# Altium schematic symbol library WR-TBL_Pluggable PCB Header.SchLib: 719 symbols (part 1 of 5) (continued)
## 691308330012
designator P?
WR-TBL Serie 3083 Vertical Reserved PCB Header with Flanges, Pluggable, pitch 3.81mm, 12p; Part Number: 691308330012; Compliance: RoHS; Modularity: No; Pin Number: 12; Rated Current [UL]: 8A; Working Voltage [UL]: 300VAC; ComponentLink1Description: Manufacturer; ComponentLink1URL: http://www.we-online.de; ComponentLink2URL: https://katalog.we-online.de/em/datasheet/691308330012.pdf; ComponentLink2Description: Datasheet; Mounting Technology: THT; Packaging: Box; Operating Temperature: -40 to +115degC; PCB/Cable/Panel: PCB; Pitch: 3.81mm; Published Date: October 2019; Type: Vertical; Publisher: Wurth Elektronik; Application: Pluggable
footprint 691308330012
pins: 1, 2, 3, 4, 5, 6, 7, 8, 9, 10, 11, 12

## 691309310002
designator P?
WR-TBL Serie 3093 Horizontal Reserved PCB Header with Flanges, Pluggable, pitch 3.81mm, 2p; Part Number: 691309310002; Compliance: RoHS; Modularity: No; Pin Number: 2; Rated Current [UL]: 8A; Working Voltage [UL]: 300VAC; ComponentLink1Description: Manufacturer; ComponentLink1URL: http://www.we-online.de; ComponentLink2URL: https://katalog.we-online.de/em/datasheet/691309310002.pdf; ComponentLink2Description: Datasheet; Mounting Technology: THT; Packaging: Box; Operating Temperature: -40 to +115degC; PCB/Cable/Panel: PCB; Pitch: 3.81mm; Published Date: October 2019; Type: Horizontal; Publisher: Wurth Elektronik; Application: Pluggable
footprint 691309310002
pins: 1, 2

## 691309310003
designator P?
WR-TBL Serie 3093 Horizontal Reserved PCB Header with Flanges, Pluggable, pitch 3.81mm, 3p; Part Number: 691309310003; Compliance: RoHS; Modularity: No; Pin Number: 3; Rated Current [UL]: 8A; Working Voltage [UL]: 300VAC; ComponentLink1Description: Manufacturer; ComponentLink1URL: http://www.we-online.de; ComponentLink2URL: https://katalog.we-online.de/em/datasheet/691309310003.pdf; ComponentLink2Description: Datasheet; Mounting Technology: THT; Packaging: Box; Operating Temperature: -40 to +115degC; PCB/Cable/Panel: PCB; Pitch: 3.81mm; Published Date: October 2019; Type: Horizontal; Publisher: Wurth Elektronik; Application: Pluggable
footprint 691309310003
pins: 1, 2, 3

## 691309310004
designator P?
WR-TBL Serie 3093 Horizontal Reserved PCB Header with Flanges, Pluggable, pitch 3.81mm, 4p; Part Number: 691309310004; Compliance: RoHS; Modularity: No; Pin Number: 4; Rated Current [UL]: 8A; Working Voltage [UL]: 300VAC; ComponentLink1Description: Manufacturer; ComponentLink1URL: http://www.we-online.de; ComponentLink2URL: https://katalog.we-online.de/em/datasheet/691309310004.pdf; ComponentLink2Description: Datasheet; Mounting Technology: THT; Packaging: Box; Operating Temperature: -40 to +115degC; PCB/Cable/Panel: PCB; Pitch: 3.81mm; Published Date: October 2019; Type: Horizontal; Publisher: Wurth Elektronik; Application: Pluggable
footprint 691309310004
pins: 1, 2, 3, 4

## 691309310005
designator P?
WR-TBL Serie 3093 Horizontal Reserved PCB Header with Flanges, Pluggable, pitch 3.81mm, 5p; Part Number: 691309310005; Compliance: RoHS; Modularity: No; Pin Number: 5; Rated Current [UL]: 8A; Working Voltage [UL]: 300VAC; ComponentLink1Description: Manufacturer; ComponentLink1URL: http://www.we-online.de; ComponentLink2URL: https://katalog.we-online.de/em/datasheet/691309310005.pdf; ComponentLink2Description: Datasheet; Mounting Technology: THT; Packaging: Box; Operating Temperature: -40 to +115degC; PCB/Cable/Panel: PCB; Pitch: 3.81mm; Published Date: October 2019; Type: Horizontal; Publisher: Wurth Elektronik; Application: Pluggable
footprint 691309310005
pins: 1, 2, 3, 4, 5

## 691309310006
designator P?
WR-TBL Serie 3093 Horizontal Reserved PCB Header with Flanges, Pluggable, pitch 3.81mm, 6p; Part Number: 691309310006; Compliance: RoHS; Modularity: No; Pin Number: 6; Rated Current [UL]: 8A; Working Voltage [UL]: 300VAC; ComponentLink1Description: Manufacturer; ComponentLink1URL: http://www.we-online.de; ComponentLink2URL: https://katalog.we-online.de/em/datasheet/691309310006.pdf; ComponentLink2Description: Datasheet; Mounting Technology: THT; Packaging: Box; Operating Temperature: -40 to +115degC; PCB/Cable/Panel: PCB; Pitch: 3.81mm; Published Date: October 2019; Type: Horizontal; Publisher: Wurth Elektronik; Application: Pluggable
footprint 691309310006
pins: 1, 2, 3, 4, 5, 6

## 691309310007
designator P?
WR-TBL Serie 3093 Horizontal Reserved PCB Header with Flanges, Pluggable, pitch 3.81mm, 7p; Part Number: 691309310007; Compliance: RoHS; Modularity: No; Pin Number: 7; Rated Current [UL]: 8A; Working Voltage [UL]: 300VAC; ComponentLink1Description: Manufacturer; ComponentLink1URL: http://www.we-online.de; ComponentLink2URL: https://katalog.we-online.de/em/datasheet/691309310007.pdf; ComponentLink2Description: Datasheet; Mounting Technology: THT; Packaging: Box; Operating Temperature: -40 to +115degC; PCB/Cable/Panel: PCB; Pitch: 3.81mm; Published Date: October 2019; Type: Horizontal; Publisher: Wurth Elektronik; Application: Pluggable
footprint 691309310007
pins: 1, 2, 3, 4, 5, 6, 7

## 691309310008
designator P?
WR-TBL Serie 3093 Horizontal Reserved PCB Header with Flanges, Pluggable, pitch 3.81mm, 8p; Part Number: 691309310008; Compliance: RoHS; Modularity: No; Pin Number: 8; Rated Current [UL]: 8A; Working Voltage [UL]: 300VAC; ComponentLink1Description: Manufacturer; ComponentLink1URL: http://www.we-online.de; ComponentLink2URL: https://katalog.we-online.de/em/datasheet/691309310008.pdf; ComponentLink2Description: Datasheet; Mounting Technology: THT; Packaging: Box; Operating Temperature: -40 to +115degC; PCB/Cable/Panel: PCB; Pitch: 3.81mm; Published Date: October 2019; Type: Horizontal; Publisher: Wurth Elektronik; Application: Pluggable
footprint 691309310008
pins: 1, 2, 3, 4, 5, 6, 7, 8

## 691309310012
designator P?
WR-TBL Serie 3093 Horizontal Reserved PCB Header with Flanges, Pluggable, pitch 3.81mm, 12p; Part Number: 691309310012; Compliance: RoHS; Modularity: No; Pin Number: 12; Rated Current [UL]: 8A; Working Voltage [UL]: 300VAC; ComponentLink1Description: Manufacturer; ComponentLink1URL: http://www.we-online.de; ComponentLink2URL: https://katalog.we-online.de/em/datasheet/691309310012.pdf; ComponentLink2Description: Datasheet; Mounting Technology: THT; Packaging: Box; Operating Temperature: -40 to +115degC; PCB/Cable/Panel: PCB; Pitch: 3.81mm; Published Date: October 2019; Type: Horizontal; Publisher: Wurth Elektronik; Application: Pluggable
footprint 691309310012
pins: 1, 2, 3, 4, 5, 6, 7, 8, 9, 10, 11, 12

## 691309410002
designator P?
WR-TBL Serie 3094 Reversed Gender Horizontal PCB Header, Pluggable, pitch 7.62mm, 2p; Part Number: 691309410002; Compliance: RoHS; Modularity: No; Pin Number: 2; Rated Current [UL]: 20A; Working Voltage [UL]: 300VAC; ComponentLink1Description: Manufacturer; ComponentLink1URL: http://www.we-online.de; ComponentLink2URL: https://katalog.we-online.de/em/datasheet/691309410002.pdf; ComponentLink2Description: Datasheet; Mounting Technology: THT; Packaging: Box; Operating Temperature: -40 to +105degC; PCB/Cable/Panel: PCB; Pitch: 7.62mm; Published Date: October 2019; Type: Horizontal; Publisher: Wurth Elektronik; Application: Pluggable
footprint 691309410002
pins: 1, 2

## 691309410003
designator P?
WR-TBL Serie 3094 Reversed Gender Horizontal PCB Header, Pluggable, pitch 7.62mm, 3p; Part Number: 691309410003; Compliance: RoHS; Modularity: No; Pin Number: 3; Rated Current [UL]: 20A; Working Voltage [UL]: 300VAC; ComponentLink1Description: Manufacturer; ComponentLink1URL: http://www.we-online.de; ComponentLink2URL: https://katalog.we-online.de/em/datasheet/691309410003.pdf; ComponentLink2Description: Datasheet; Mounting Technology: THT; Packaging: Box; Operating Temperature: -40 to +105degC; PCB/Cable/Panel: PCB; Pitch: 7.62mm; Published Date: October 2019; Type: Horizontal; Publisher: Wurth Elektronik; Application: Pluggable
footprint 691309410003
pins: 1, 2, 3

## 691309410004
designator P?
WR-TBL Serie 3094 Reversed Gender Horizontal PCB Header, Pluggable, pitch 7.62mm, 4p; Part Number: 691309410004; Compliance: RoHS; Modularity: No; Pin Number: 4; Rated Current [UL]: 20A; Working Voltage [UL]: 300VAC; ComponentLink1Description: Manufacturer; ComponentLink1URL: http://www.we-online.de; ComponentLink2URL: https://katalog.we-online.de/em/datasheet/691309410004.pdf; ComponentLink2Description: Datasheet; Mounting Technology: THT; Packaging: Box; Operating Temperature: -40 to +105degC; PCB/Cable/Panel: PCB; Pitch: 7.62mm; Published Date: October 2019; Type: Horizontal; Publisher: Wurth Elektronik; Application: Pluggable
footprint 691309410004
pins: 1, 2, 3, 4

## 691309410005
designator P?
WR-TBL Serie 3094 Reversed Gender Horizontal PCB Header, Pluggable, pitch 7.62mm, 5p; Part Number: 691309410005; Compliance: RoHS; Modularity: No; Pin Number: 5; Rated Current [UL]: 20A; Working Voltage [UL]: 300VAC; ComponentLink1Description: Manufacturer; ComponentLink1URL: http://www.we-online.de; ComponentLink2URL: https://katalog.we-online.de/em/datasheet/691309410005.pdf; ComponentLink2Description: Datasheet; Mounting Technology: THT; Packaging: Box; Operating Temperature: -40 to +105degC; PCB/Cable/Panel: PCB; Pitch: 7.62mm; Published Date: October 2019; Type: Horizontal; Publisher: Wurth Elektronik; Application: Pluggable
footprint 691309410005
pins: 1, 2, 3, 4, 5

## 691309410006
designator P?
WR-TBL Serie 3094 Reversed Gender Horizontal PCB Header, Pluggable, pitch 7.62mm, 6p; Part Number: 691309410006; Compliance: RoHS; Modularity: No; Pin Number: 6; Rated Current [UL]: 20A; Working Voltage [UL]: 300VAC; ComponentLink1Description: Manufacturer; ComponentLink1URL: http://www.we-online.de; ComponentLink2URL: https://katalog.we-online.de/em/datasheet/691309410006.pdf; ComponentLink2Description: Datasheet; Mounting Technology: THT; Packaging: Box; Operating Temperature: -40 to +105degC; PCB/Cable/Panel: PCB; Pitch: 7.62mm; Published Date: October 2019; Type: Horizontal; Publisher: Wurth Elektronik; Application: Pluggable
footprint 691309410006
pins: 1, 2, 3, 4, 5, 6

## 691309410007
designator P?
WR-TBL Serie 3094 Reversed Gender Horizontal PCB Header, Pluggable, pitch 7.62mm, 7p; Part Number: 691309410007; Compliance: RoHS; Modularity: No; Pin Number: 7; Rated Current [UL]: 20A; Working Voltage [UL]: 300VAC; ComponentLink1Description: Manufacturer; ComponentLink1URL: http://www.we-online.de; ComponentLink2URL: https://katalog.we-online.de/em/datasheet/691309410007.pdf; ComponentLink2Description: Datasheet; Mounting Technology: THT; Packaging: Box; Operating Temperature: -40 to +105degC; PCB/Cable/Panel: PCB; Pitch: 7.62mm; Published Date: October 2019; Type: Horizontal; Publisher: Wurth Elektronik; Application: Pluggable
footprint 691309410007
pins: 1, 2, 3, 4, 5, 6, 7

## 691309410008
designator P?
WR-TBL Serie 3094 Reversed Gender Horizontal PCB Header, Pluggable, pitch 7.62mm, 8p; Part Number: 691309410008; Compliance: RoHS; Modularity: No; Pin Number: 8; Rated Current [UL]: 20A; Working Voltage [UL]: 300VAC; ComponentLink1Description: Manufacturer; ComponentLink1URL: http://www.we-online.de; ComponentLink2URL: https://katalog.we-online.de/em/datasheet/691309410008.pdf; ComponentLink2Description: Datasheet; Mounting Technology: THT; Packaging: Box; Operating Temperature: -40 to +105degC; PCB/Cable/Panel: PCB; Pitch: 7.62mm; Published Date: October 2019; Type: Horizontal; Publisher: Wurth Elektronik; Application: Pluggable
footprint 691309410008
pins: 1, 2, 3, 4, 5, 6, 7, 8

## 691309410012
designator P?
WR-TBL Serie 3094 Reversed Gender Horizontal PCB Header, Pluggable, pitch 7.62mm, 12p; Part Number: 691309410012; Compliance: RoHS; Modularity: No; Pin Number: 12; Rated Current [UL]: 20A; Working Voltage [UL]: 300VAC; ComponentLink1Description: Manufacturer; ComponentLink1URL: http://www.we-online.de; ComponentLink2URL: https://katalog.we-online.de/em/datasheet/691309410012.pdf; ComponentLink2Description: Datasheet; Mounting Technology: THT; Packaging: Box; Operating Temperature: -40 to +105degC; PCB/Cable/Panel: PCB; Pitch: 7.62mm; Published Date: October 2019; Type: Horizontal; Publisher: Wurth Elektronik; Application: Pluggable
footprint 691309410012
pins: 1, 2, 3, 4, 5, 6, 7, 8, 9, 10, 11, 12

## 691309510002
designator P?
WR-TBL Serie 3095 Reversed Gender Horizontal PCB Header, Pluggable, pitch 5.08mm, 2p; Part Number: 691309510002; Compliance: RoHS; Modularity: No; Pin Number: 2; Rated Current [UL]: 20A; Working Voltage [UL]: 300VAC; ComponentLink1Description: Manufacturer; ComponentLink1URL: http://www.we-online.de; ComponentLink2URL: https://katalog.we-online.de/em/datasheet/691309510002.pdf; ComponentLink2Description: Datasheet; Mounting Technology: THT; Packaging: Box; Operating Temperature: -40 to +105degC; PCB/Cable/Panel: PCB; Pitch: 5.08mm; Published Date: October 2019; Type: Horizontal; Publisher: Wurth Elektronik; Application: Pluggable
footprint 691309510002
pins: 1, 2

## 691309510003
designator P?
WR-TBL Serie 3095 Reversed Gender Horizontal PCB Header, Pluggable, pitch 5.08mm, 3p; Part Number: 691309510003; Compliance: RoHS; Modularity: No; Pin Number: 3; Rated Current [UL]: 20A; Working Voltage [UL]: 300VAC; ComponentLink1Description: Manufacturer; ComponentLink1URL: http://www.we-online.de; ComponentLink2URL: https://katalog.we-online.de/em/datasheet/691309510003.pdf; ComponentLink2Description: Datasheet; Mounting Technology: THT; Packaging: Box; Operating Temperature: -40 to +105degC; PCB/Cable/Panel: PCB; Pitch: 5.08mm; Published Date: October 2019; Type: Horizontal; Publisher: Wurth Elektronik; Application: Pluggable
footprint 691309510003
pins: 1, 2, 3

## 691309510004
designator P?
WR-TBL Serie 3095 Reversed Gender Horizontal PCB Header, Pluggable, pitch 5.08mm, 4p; Part Number: 691309510004; Compliance: RoHS; Modularity: No; Pin Number: 4; Rated Current [UL]: 20A; Working Voltage [UL]: 300VAC; ComponentLink1Description: Manufacturer; ComponentLink1URL: http://www.we-online.de; ComponentLink2URL: https://katalog.we-online.de/em/datasheet/691309510004.pdf; ComponentLink2Description: Datasheet; Mounting Technology: THT; Packaging: Box; Operating Temperature: -40 to +105degC; PCB/Cable/Panel: PCB; Pitch: 5.08mm; Published Date: October 2019; Type: Horizontal; Publisher: Wurth Elektronik; Application: Pluggable
footprint 691309510004
pins: 1, 2, 3, 4

## 691309510005
designator P?
WR-TBL Serie 3095 Reversed Gender Horizontal PCB Header, Pluggable, pitch 5.08mm, 5p; Part Number: 691309510005; Compliance: RoHS; Modularity: No; Pin Number: 5; Rated Current [UL]: 20A; Working Voltage [UL]: 300VAC; ComponentLink1Description: Manufacturer; ComponentLink1URL: http://www.we-online.de; ComponentLink2URL: https://katalog.we-online.de/em/datasheet/691309510005.pdf; ComponentLink2Description: Datasheet; Mounting Technology: THT; Packaging: Box; Operating Temperature: -40 to +105degC; PCB/Cable/Panel: PCB; Pitch: 5.08mm; Published Date: October 2019; Type: Horizontal; Publisher: Wurth Elektronik; Application: Pluggable
footprint 691309510005
pins: 1, 2, 3, 4, 5

## 691309510006
designator P?
WR-TBL Serie 3095 Reversed Gender Horizontal PCB Header, Pluggable, pitch 5.08mm, 6p; Part Number: 691309510006; Compliance: RoHS; Modularity: No; Pin Number: 6; Rated Current [UL]: 20A; Working Voltage [UL]: 300VAC; ComponentLink1Description: Manufacturer; ComponentLink1URL: http://www.we-online.de; ComponentLink2URL: https://katalog.we-online.de/em/datasheet/691309510006.pdf; ComponentLink2Description: Datasheet; Mounting Technology: THT; Packaging: Box; Operating Temperature: -40 to +105degC; PCB/Cable/Panel: PCB; Pitch: 5.08mm; Published Date: October 2019; Type: Horizontal; Publisher: Wurth Elektronik; Application: Pluggable
footprint 691309510006
pins: 1, 2, 3, 4, 5, 6

## 691309510007
designator P?
WR-TBL Serie 3095 Reversed Gender Horizontal PCB Header, Pluggable, pitch 5.08mm, 7p; Part Number: 691309510007; Compliance: RoHS; Modularity: No; Pin Number: 7; Rated Current [UL]: 20A; Working Voltage [UL]: 300VAC; ComponentLink1Description: Manufacturer; ComponentLink1URL: http://www.we-online.de; ComponentLink2URL: https://katalog.we-online.de/em/datasheet/691309510007.pdf; ComponentLink2Description: Datasheet; Mounting Technology: THT; Packaging: Box; Operating Temperature: -40 to +105degC; PCB/Cable/Panel: PCB; Pitch: 5.08mm; Published Date: October 2019; Type: Horizontal; Publisher: Wurth Elektronik; Application: Pluggable
footprint 691309510007
pins: 1, 2, 3, 4, 5, 6, 7

## 691309510008
designator P?
WR-TBL Serie 3095 Reversed Gender Horizontal PCB Header, Pluggable, pitch 5.08mm, 8p; Part Number: 691309510008; Compliance: RoHS; Modularity: No; Pin Number: 8; Rated Current [UL]: 20A; Working Voltage [UL]: 300VAC; ComponentLink1Description: Manufacturer; ComponentLink1URL: http://www.we-online.de; ComponentLink2URL: https://katalog.we-online.de/em/datasheet/691309510008.pdf; ComponentLink2Description: Datasheet; Mounting Technology: THT; Packaging: Box; Operating Temperature: -40 to +105degC; PCB/Cable/Panel: PCB; Pitch: 5.08mm; Published Date: October 2019; Type: Horizontal; Publisher: Wurth Elektronik; Application: Pluggable
footprint 691309510008
pins: 1, 2, 3, 4, 5, 6, 7, 8

## 691309510012
designator P?
WR-TBL Serie 3095 Reversed Gender Horizontal PCB Header, Pluggable, pitch 5.08mm, 12p; Part Number: 691309510012; Compliance: RoHS; Modularity: No; Pin Number: 12; Rated Current [UL]: 20A; Working Voltage [UL]: 300VAC; ComponentLink1Description: Manufacturer; ComponentLink1URL: http://www.we-online.de; ComponentLink2URL: https://katalog.we-online.de/em/datasheet/691309510012.pdf; ComponentLink2Description: Datasheet; Mounting Technology: THT; Packaging: Box; Operating Temperature: -40 to +105degC; PCB/Cable/Panel: PCB; Pitch: 5.08mm; Published Date: October 2019; Type: Horizontal; Publisher: Wurth Elektronik; Application: Pluggable
footprint 691309510012
pins: 1, 2, 3, 4, 5, 6, 7, 8, 9, 10, 11, 12

## 691310340002
designator P?
WR-TBL Serie 3103 Horizontal PCB Header with Flanges, Pluggable, pitch 3.81mm, 2p; Part Number: 691310340002; Compliance: RoHS; Modularity: No; Pin Number: 2; Rated Current [UL]: 8A; Working Voltage [UL]: 300VAC; ComponentLink1Description: Manufacturer; ComponentLink1URL: http://www.we-online.de; ComponentLink2URL: https://katalog.we-online.de/em/datasheet/691310340002.pdf; ComponentLink2Description: Datasheet; Mounting Technology: THT; Packaging: Box; Operating Temperature: -40 to +115degC; PCB/Cable/Panel: PCB; Pitch: 3.81mm; Published Date: October 2019; Type: Horizontal; Publisher: Wurth Elektronik; Application: Pluggable
footprint 691310340002
pins: 1, 2

## 691310340003
designator P?
WR-TBL Serie 3103 Horizontal PCB Header with Flanges, Pluggable, pitch 3.81mm, 3p; Part Number: 691310340003; Compliance: RoHS; Modularity: No; Pin Number: 3; Rated Current [UL]: 8A; Working Voltage [UL]: 300VAC; ComponentLink1Description: Manufacturer; ComponentLink1URL: http://www.we-online.de; ComponentLink2URL: https://katalog.we-online.de/em/datasheet/691310340003.pdf; ComponentLink2Description: Datasheet; Mounting Technology: THT; Packaging: Box; Operating Temperature: -40 to +115degC; PCB/Cable/Panel: PCB; Pitch: 3.81mm; Published Date: October 2019; Type: Horizontal; Publisher: Wurth Elektronik; Application: Pluggable
footprint 691310340003
pins: 1, 2, 3

## 691310340004
designator P?
WR-TBL Serie 3103 Horizontal PCB Header with Flanges, Pluggable, pitch 3.81mm, 4p; Part Number: 691310340004; Compliance: RoHS; Modularity: No; Pin Number: 4; Rated Current [UL]: 8A; Working Voltage [UL]: 300VAC; ComponentLink1Description: Manufacturer; ComponentLink1URL: http://www.we-online.de; ComponentLink2URL: https://katalog.we-online.de/em/datasheet/691310340004.pdf; ComponentLink2Description: Datasheet; Mounting Technology: THT; Packaging: Box; Operating Temperature: -40 to +115degC; PCB/Cable/Panel: PCB; Pitch: 3.81mm; Published Date: October 2019; Type: Horizontal; Publisher: Wurth Elektronik; Application: Pluggable
footprint 691310340004
pins: 1, 2, 3, 4

## 691310340005
designator P?
WR-TBL Serie 3103 Horizontal PCB Header with Flanges, Pluggable, pitch 3.81mm, 5p; Part Number: 691310340005; Compliance: RoHS; Modularity: No; Pin Number: 5; Rated Current [UL]: 8A; Working Voltage [UL]: 300VAC; ComponentLink1Description: Manufacturer; ComponentLink1URL: http://www.we-online.de; ComponentLink2URL: https://katalog.we-online.de/em/datasheet/691310340005.pdf; ComponentLink2Description: Datasheet; Mounting Technology: THT; Packaging: Box; Operating Temperature: -40 to +115degC; PCB/Cable/Panel: PCB; Pitch: 3.81mm; Published Date: October 2019; Type: Horizontal; Publisher: Wurth Elektronik; Application: Pluggable
footprint 691310340005
pins: 1, 2, 3, 4, 5

## 691310340006
designator P?
WR-TBL Serie 3103 Horizontal PCB Header with Flanges, Pluggable, pitch 3.81mm, 6p; Part Number: 691310340006; Compliance: RoHS; Modularity: No; Pin Number: 6; Rated Current [UL]: 8A; Working Voltage [UL]: 300VAC; ComponentLink1Description: Manufacturer; ComponentLink1URL: http://www.we-online.de; ComponentLink2URL: https://katalog.we-online.de/em/datasheet/691310340006.pdf; ComponentLink2Description: Datasheet; Mounting Technology: THT; Packaging: Box; Operating Temperature: -40 to +115degC; PCB/Cable/Panel: PCB; Pitch: 3.81mm; Published Date: October 2019; Type: Horizontal; Publisher: Wurth Elektronik; Application: Pluggable
footprint 691310340006
pins: 1, 2, 3, 4, 5, 6

## 691310340007
designator P?
WR-TBL Serie 3103 Horizontal PCB Header with Flanges, Pluggable, pitch 3.81mm, 7p; Part Number: 691310340007; Compliance: RoHS; Modularity: No; Pin Number: 7; Rated Current [UL]: 8A; Working Voltage [UL]: 300VAC; ComponentLink1Description: Manufacturer; ComponentLink1URL: http://www.we-online.de; ComponentLink2URL: https://katalog.we-online.de/em/datasheet/691310340007.pdf; ComponentLink2Description: Datasheet; Mounting Technology: THT; Packaging: Box; Operating Temperature: -40 to +115degC; PCB/Cable/Panel: PCB; Pitch: 3.81mm; Published Date: October 2019; Type: Horizontal; Publisher: Wurth Elektronik; Application: Pluggable
footprint 691310340007
pins: 1, 2, 3, 4, 5, 6, 7

## 691310340008
designator P?
WR-TBL Serie 3103 Horizontal PCB Header with Flanges, Pluggable, pitch 3.81mm, 8p; Part Number: 691310340008; Compliance: RoHS; Modularity: No; Pin Number: 8; Rated Current [UL]: 8A; Working Voltage [UL]: 300VAC; ComponentLink1Description: Manufacturer; ComponentLink1URL: http://www.we-online.de; ComponentLink2URL: https://katalog.we-online.de/em/datasheet/691310340008.pdf; ComponentLink2Description: Datasheet; Mounting Technology: THT; Packaging: Box; Operating Temperature: -40 to +115degC; PCB/Cable/Panel: PCB; Pitch: 3.81mm; Published Date: October 2019; Type: Horizontal; Publisher: Wurth Elektronik; Application: Pluggable
footprint 691310340008
pins: 1, 2, 3, 4, 5, 6, 7, 8

## 691310340012
designator P?
WR-TBL Serie 3103 Horizontal PCB Header with Flanges, Pluggable, pitch 3.81mm, 12p; Part Number: 691310340012; Compliance: RoHS; Modularity: No; Pin Number: 12; Rated Current [UL]: 8A; Working Voltage [UL]: 300VAC; ComponentLink1Description: Manufacturer; ComponentLink1URL: http://www.we-online.de; ComponentLink2URL: https://katalog.we-online.de/em/datasheet/691310340012.pdf; ComponentLink2Description: Datasheet; Mounting Technology: THT; Packaging: Box; Operating Temperature: -40 to +115degC; PCB/Cable/Panel: PCB; Pitch: 3.81mm; Published Date: October 2019; Type: Horizontal; Publisher: Wurth Elektronik; Application: Pluggable
footprint 691310340012
pins: 1, 2, 3, 4, 5, 6, 7, 8, 9, 10, 11, 12

## 691311400002
designator P?
WR-TBL Serie 3114 Open Vertical PCB Header, Pluggable, pitch 7.62mm, 2p; Part Number: 691311400002; Compliance: RoHS; Modularity: No; Pin Number: 2; Rated Current [UL]: 20A; Working Voltage [UL]: 300VAC; ComponentLink1Description: Manufacturer; ComponentLink1URL: http://www.we-online.de; ComponentLink2URL: https://katalog.we-online.de/em/datasheet/691311400002.pdf; ComponentLink2Description: Datasheet; Mounting Technology: THT; Packaging: Box; Operating Temperature: -40 to +105degC; PCB/Cable/Panel: PCB; Pitch: 7.62mm; Published Date: October 2019; Type: Vertical; Publisher: Wurth Elektronik; Application: Pluggable
footprint 691311400002
pins: 1, 2

## 691311400003
designator P?
WR-TBL Serie 3114 Open Vertical PCB Header, Pluggable, pitch 7.62mm, 3p; Part Number: 691311400003; Compliance: RoHS; Modularity: No; Pin Number: 3; Rated Current [UL]: 20A; Working Voltage [UL]: 300VAC; ComponentLink1Description: Manufacturer; ComponentLink1URL: http://www.we-online.de; ComponentLink2URL: https://katalog.we-online.de/em/datasheet/691311400003.pdf; ComponentLink2Description: Datasheet; Mounting Technology: THT; Packaging: Box; Operating Temperature: -40 to +105degC; PCB/Cable/Panel: PCB; Pitch: 7.62mm; Published Date: October 2019; Type: Vertical; Publisher: Wurth Elektronik; Application: Pluggable
footprint 691311400003
pins: 1, 2, 3

## 691311400004
designator P?
WR-TBL Serie 3114 Open Vertical PCB Header, Pluggable, pitch 7.62mm, 4p; Part Number: 691311400004; Compliance: RoHS; Modularity: No; Pin Number: 4; Rated Current [UL]: 20A; Working Voltage [UL]: 300VAC; ComponentLink1Description: Manufacturer; ComponentLink1URL: http://www.we-online.de; ComponentLink2URL: https://katalog.we-online.de/em/datasheet/691311400004.pdf; ComponentLink2Description: Datasheet; Mounting Technology: THT; Packaging: Box; Operating Temperature: -40 to +105degC; PCB/Cable/Panel: PCB; Pitch: 7.62mm; Published Date: October 2019; Type: Vertical; Publisher: Wurth Elektronik; Application: Pluggable
footprint 691311400004
pins: 1, 2, 3, 4

## 691311400005
designator P?
WR-TBL Serie 3114 Open Vertical PCB Header, Pluggable, pitch 7.62mm, 5p; Part Number: 691311400005; Compliance: RoHS; Modularity: No; Pin Number: 5; Rated Current [UL]: 20A; Working Voltage [UL]: 300VAC; ComponentLink1Description: Manufacturer; ComponentLink1URL: http://www.we-online.de; ComponentLink2URL: https://katalog.we-online.de/em/datasheet/691311400005.pdf; ComponentLink2Description: Datasheet; Mounting Technology: THT; Packaging: Box; Operating Temperature: -40 to +105degC; PCB/Cable/Panel: PCB; Pitch: 7.62mm; Published Date: October 2019; Type: Vertical; Publisher: Wurth Elektronik; Application: Pluggable
footprint 691311400005
pins: 1, 2, 3, 4, 5

## 691311400006
designator P?
WR-TBL Serie 3114 Open Vertical PCB Header, Pluggable, pitch 7.62mm, 6p; Part Number: 691311400006; Compliance: RoHS; Modularity: No; Pin Number: 6; Rated Current [UL]: 20A; Working Voltage [UL]: 300VAC; ComponentLink1Description: Manufacturer; ComponentLink1URL: http://www.we-online.de; ComponentLink2URL: https://katalog.we-online.de/em/datasheet/691311400006.pdf; ComponentLink2Description: Datasheet; Mounting Technology: THT; Packaging: Box; Operating Temperature: -40 to +105degC; PCB/Cable/Panel: PCB; Pitch: 7.62mm; Published Date: October 2019; Type: Vertical; Publisher: Wurth Elektronik; Application: Pluggable
footprint 691311400006
pins: 1, 2, 3, 4, 5, 6

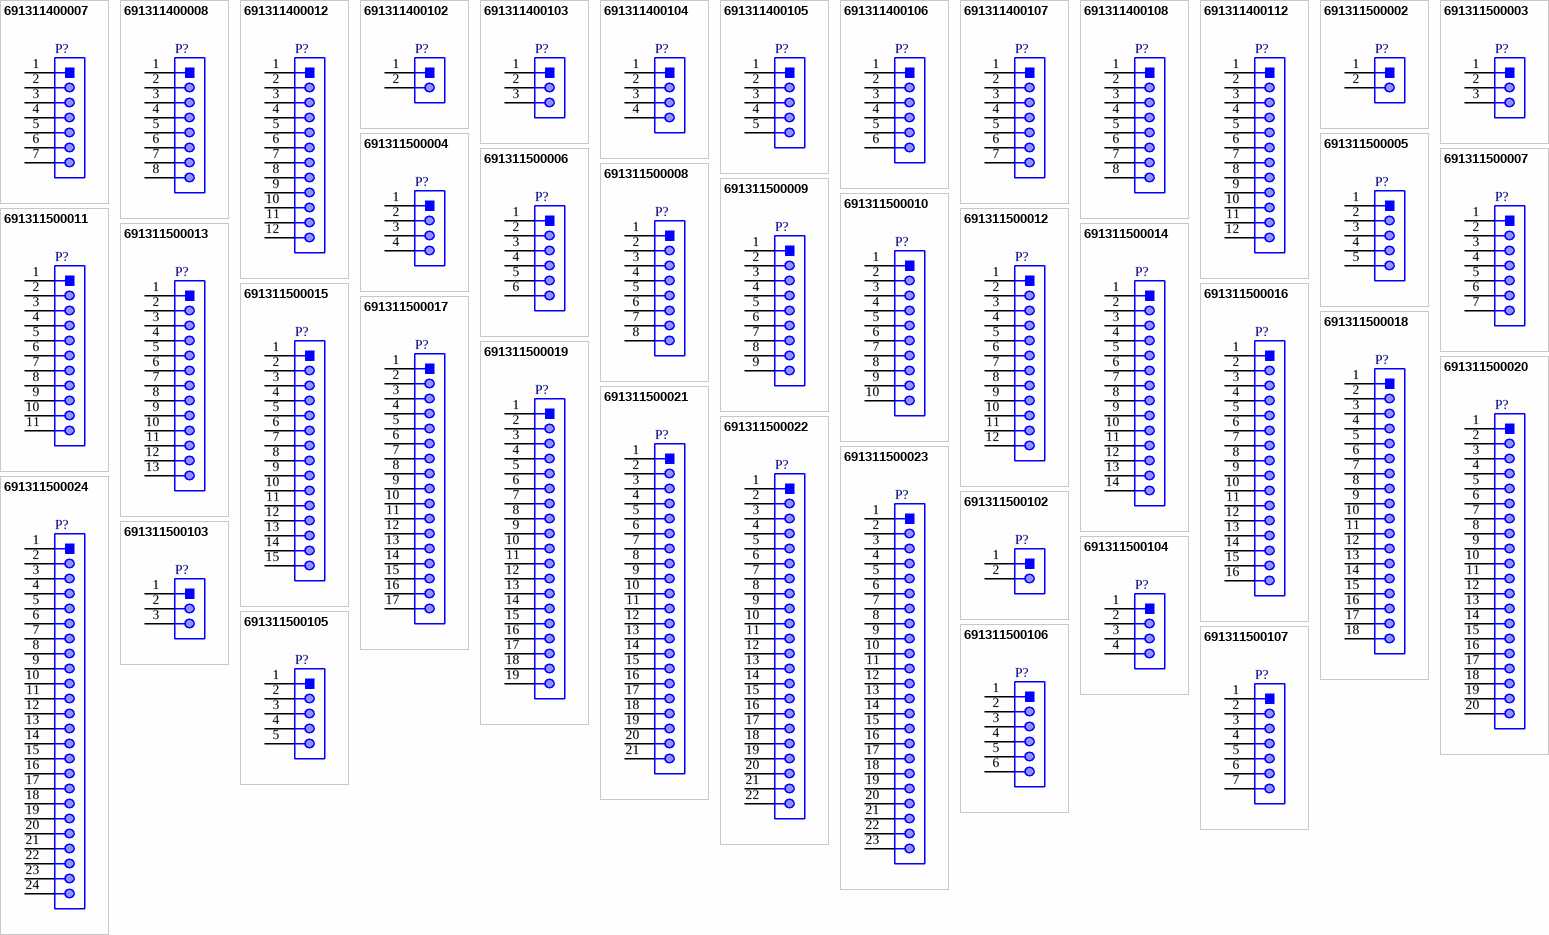
[diagram p3: symbols 691311400007 to 691311500107]

## 691311400007
designator P?
WR-TBL Serie 3114 Open Vertical PCB Header, Pluggable, pitch 7.62mm, 7p; Part Number: 691311400007; Compliance: RoHS; Modularity: No; Pin Number: 7; Rated Current [UL]: 20A; Working Voltage [UL]: 300VAC; ComponentLink1Description: Manufacturer; ComponentLink1URL: http://www.we-online.de; ComponentLink2URL: https://katalog.we-online.de/em/datasheet/691311400007.pdf; ComponentLink2Description: Datasheet; Mounting Technology: THT; Packaging: Box; Operating Temperature: -40 to +105degC; PCB/Cable/Panel: PCB; Pitch: 7.62mm; Published Date: October 2019; Type: Vertical; Publisher: Wurth Elektronik; Application: Pluggable
footprint 691311400007
pins: 1, 2, 3, 4, 5, 6, 7

## 691311400008
designator P?
WR-TBL Serie 3114 Open Vertical PCB Header, Pluggable, pitch 7.62mm, 8p; Part Number: 691311400008; Compliance: RoHS; Modularity: No; Pin Number: 8; Rated Current [UL]: 20A; Working Voltage [UL]: 300VAC; ComponentLink1Description: Manufacturer; ComponentLink1URL: http://www.we-online.de; ComponentLink2URL: https://katalog.we-online.de/em/datasheet/691311400008.pdf; ComponentLink2Description: Datasheet; Mounting Technology: THT; Packaging: Box; Operating Temperature: -40 to +105degC; PCB/Cable/Panel: PCB; Pitch: 7.62mm; Published Date: October 2019; Type: Vertical; Publisher: Wurth Elektronik; Application: Pluggable
footprint 691311400008
pins: 1, 2, 3, 4, 5, 6, 7, 8

## 691311400012
designator P?
WR-TBL Serie 3114 Open Vertical PCB Header, Pluggable, pitch 7.62mm, 12p; Part Number: 691311400012; Compliance: RoHS; Modularity: No; Pin Number: 12; Rated Current [UL]: 20A; Working Voltage [UL]: 300VAC; ComponentLink1Description: Manufacturer; ComponentLink1URL: http://www.we-online.de; ComponentLink2URL: https://katalog.we-online.de/em/datasheet/691311400012.pdf; ComponentLink2Description: Datasheet; Mounting Technology: THT; Packaging: Box; Operating Temperature: -40 to +105degC; PCB/Cable/Panel: PCB; Pitch: 7.62mm; Published Date: October 2019; Type: Vertical; Publisher: Wurth Elektronik; Application: Pluggable
footprint 691311400012
pins: 1, 2, 3, 4, 5, 6, 7, 8, 9, 10, 11, 12

## 691311400102
designator P?
WR-TBL Serie 3114 Close Vertical PCB Header, Pluggable, pitch 7.62mm, 2p; Part Number: 691311400102; Compliance: RoHS; Modularity: No; Pin Number: 2; Rated Current [UL]: 20A; Working Voltage [UL]: 300VAC; ComponentLink1Description: Manufacturer; ComponentLink1URL: http://www.we-online.de; ComponentLink2URL: https://katalog.we-online.de/em/datasheet/691311400102.pdf; ComponentLink2Description: Datasheet; Mounting Technology: THT; Packaging: Box; Operating Temperature: -40 to +105degC; PCB/Cable/Panel: PCB; Pitch: 7.62mm; Published Date: October 2019; Type: Vertical; Publisher: Wurth Elektronik; Application: Pluggable
footprint 691311400102
pins: 1, 2

## 691311400103
designator P?
WR-TBL Serie 3114 Close Vertical PCB Header, Pluggable, pitch 7.62mm, 3p; Part Number: 691311400103; Compliance: RoHS; Modularity: No; Pin Number: 3; Rated Current [UL]: 20A; Working Voltage [UL]: 300VAC; ComponentLink1Description: Manufacturer; ComponentLink1URL: http://www.we-online.de; ComponentLink2URL: https://katalog.we-online.de/em/datasheet/691311400103.pdf; ComponentLink2Description: Datasheet; Mounting Technology: THT; Packaging: Box; Operating Temperature: -40 to +105degC; PCB/Cable/Panel: PCB; Pitch: 7.62mm; Published Date: October 2019; Type: Vertical; Publisher: Wurth Elektronik; Application: Pluggable
footprint 691311400103
pins: 1, 2, 3
